# Altium footprint library Connectors SMD.PcbLib: 130 footprints (part 1 of 12) (continued)
## ERNI_054594 [mm] "12 Contacts Pitch 1.27  SMC Right Angle Male Connector Type B" (continued)
  text "a6" at -4,-2.8 h1
  text "a1" at 2.7,-2.8 h1
  text "b" at 4.78,0.6 h0.9
  text "a" at 4.725,-0.5 h0.9
  text "6" at -3.875,-0.2 h0.9
3D body: height 4.25, standoff -0.7, extent -6.285,-9.085 6.285,0.915

## ERNI_054595 [mil] "26 Contacts Pitch 1.27  SMC Right Angle Male Connector Type B"
height 165.35
pads (32):
  rect 31.5x31.5 smd: A1(300,-25) A2(250,-25) A3(200,-25) A4(150,-25) A5(100,-25) A6(50,-25) A7(0,-25) A8(-50,-25) A9(-100,-25) A10(-150,-25) A11(-200,-25) A12(-250,-25) A13(-300,-25) B1(300,25) B2(250,25) B3(200,25) B4(150,25) B5(100,25) B6(50,25) B7(0,25) B8(-50,25) B9(-100,25) B10(-150,25) B11(-200,25) B12(-250,25) B13(-300,25)
  rect 47.24x98.43 smd: Mec1(-398.82,-3.35) Mec2(-398.82,-204.13) Mec3(398.82,-3.35) Mec4(398.82,-204.13)
  round 39.37 hole 62.99 unplated mask+15.75: Mec5(-387.01,-103.74) Mec6(387.01,-103.74)
Top Overlay:
  circle w9.84: c300,65 r4.92
  lines w7.87: -378.78,-265 -378.78,-355.73 378.78,-355.73 378.78,-265 ; -365,-32.87 -351.22,-32.87 -348.77,-39.6 ccw(c-330.27,-32.87) -330.27,-52.55 330.27,-52.55 ccw(c330.27,-32.87) 348.77,-39.6 351.22,-32.87 365,-32.87 ; -351.61,-158.86 351.61,-158.86
  text "a" at 358.27,-20.67 h35.43
  text "b" at 362.2,22.64 h35.43
  text "13" at -326.77,-16.73 h35.43
Mechanical 8:
  drawing of 188 lines, arcs and shapes, not listed
Mechanical 14:
  drawing of 326 lines, arcs and shapes, not listed
  text "b" at 362.2,22.64 h35.43
  text "a" at 358.27,-20.67 h35.43
  text "13" at -326.77,-16.73 h35.43
  text "a1" at 290.55,-110.24 h39.37
  text "a13" at -330.71,-110.24 h39.37
Mechanical 15:
  lines w1.97: -432.33,-365.58 432.33,-365.58 432.33,55.71 -432.33,55.71 -432.33,-365.58
3D body: height 165.35, standoff 0, extent -431.44,-356.31 413.53,37.4

## ERNI_054596 [mil] "50 Contacts Pitch 1.27  SMC Right Angle Male Connector Type B"
height 165.35
pads (56):
  rect 31.5x31.5 smd: A1(600,-25) A2(550,-25) A3(500,-25) A4(450,-25) A5(400,-25) A6(350,-25) A7(300,-25) A8(250,-25) A9(200,-25) A10(150,-25) A11(100,-25) A12(50,-25) A13(0,-25) A14(-50,-25) A15(-100,-25) A16(-150,-25) A17(-200,-25) A18(-250,-25) A19(-300,-25) A20(-350,-25) A21(-400,-25) A22(-450,-25) A23(-500,-25) A24(-550,-25) A25(-600,-25) B1(600,25) B2(550,25) B3(500,25) B4(450,25) B5(400,25) B6(350,25) B7(300,25) B8(250,25) B9(200,25) B10(150,25) B11(100,25) B12(50,25) B13(0,25) B14(-50,25) B15(-100,25) B16(-150,25) B17(-200,25) B18(-250,25) B19(-300,25) B20(-350,25) B21(-400,25) B22(-450,25) B23(-500,25) B24(-550,25) B25(-600,25)
  rect 47.24x98.43 smd: Mec1(-698.82,-3.35) Mec2(-698.43,-204.13) Mec3(698.43,-3.35) Mec4(699.21,-204.13)
  round 39.37 hole 62.99 unplated mask+15.75: Mec5(-687.01,-103.74) Mec6(687.01,-103.74)
Top Overlay:
  circle w9.84: c600,65 r4.92
  lines w7.87: -678.74,-271.65 -678.74,-355.71 681.26,-355.71 681.26,-271.65 ; -659.45,-50.71 659.45,-50.71
  text "25" at -627.95,-26.57 h35.43
  text "a" at 657.28,-33.46 h35.43
  text "b" at 662.2,20.67 h35.43
Mechanical 8:
  lines w1.97: 615.75,9.25 615.75,40.75
Mechanical 13:
  lines w3.94: -728.74,-260.71 -728.74,54.29 -663.74,54.29 -663.74,-50.71 671.26,-50.71 671.26,54.29 731.26,54.29 731.26,-260.71 681.26,-260.71 681.26,-355.71 -678.74,-355.71 -678.74,-260.71 -728.74,-260.71
Mechanical 14:
  lines w3.94: -728.74,-260.71 -728.74,54.29 -663.74,54.29 -663.74,-50.71 671.26,-50.71 671.26,54.29 731.26,54.29 731.26,-260.71 681.26,-260.71 681.26,-355.71 -678.74,-355.71 -678.74,-260.71 -728.74,-260.71
  text "b" at 662.2,20.67 h35.43
  text "a" at 657.28,-33.46 h35.43
  text "a1" at 590.55,-110.24 h39.37
  text "a25" at -629.92,-110.24 h39.37
Mechanical 15:
  lines w1.97: -739.17,-366.14 741.14,-366.14
  lines w3.94: -739.17,-366.14 -739.17,63.98 741.14,63.98 741.14,-366.14
3D body: height 165.35, standoff 0, extent -728.72,-355.69 731.24,54.27

## ERNI_063209 [mm] "26 Contacts Pitch 1.27  SMC Straight Male Connector Type Q"
height 8.2
pads (32):
  rect 0.8x1.1 smd: A1(7.623,-2.75) A2(6.353,-2.75) A3(5.083,-2.75) A4(3.813,-2.75) A5(2.543,-2.75) A6(1.273,-2.75) A7(0.003,-2.75) A8(-1.267,-2.75) A9(-2.537,-2.75) A10(-3.807,-2.75) A11(-5.077,-2.75) A12(-6.347,-2.75) A13(-7.617,-2.75) B1(7.623,2.75) B2(6.353,2.75) B3(5.083,2.75) B4(3.812,2.75) B5(2.542,2.75) B6(1.272,2.75) B7(0.002,2.75) B8(-1.268,2.75) B9(-2.538,2.75) B10(-3.808,2.75) B11(-5.078,2.75) B12(-6.348,2.75) B13(-7.618,2.75)
  rect 1.2x2.5 smd: Mec1(10.133,-2.55) Mec2(10.123,2.55) Mec3(-10.118,-2.55) Mec4(-10.138,2.55)
  round 1 hole 1.6 unplated mask+0.3: Mec5(9.833,0) Mec6(-9.828,0)
Top Overlay:
  circle w0.25: c7.622,-3.766 r0.125
  lines w0.2: -9.228,0.922 -9.228,1.625 9.233,1.625 9.233,0.922 ; -9.2,1.9 9.2,1.9 ; -9.028,-0.77 -9.028,-1.925 ; -8.928,0.65 -8.928,1.325 8.933,1.325 8.933,0.65 ; -8.728,-0.15 -8.728,-1.625 ; -8.728,0.15 -8.428,0.15 -8.428,-1.325 8.433,-1.325 8.433,0.15 8.733,0.15 ; 8.733,-0.15 8.733,-1.625 ; 9.033,-0.77 9.033,-1.925 ; -9.028,-1.925 9.033,-1.925 ; -9.028,-1.925 -8.728,-1.625 ; -8.728,-1.625 8.733,-1.625 ; 8.733,-1.625 9.033,-1.925 ; -7.83,-0.783 -7.41,-0.783 -7.41,-0.485 -7.83,-0.485 -7.83,-0.783 ; -7.83,0.487 -7.41,0.487 -7.41,0.785 -7.83,0.785 -7.83,0.487 ; -6.56,-0.783 -6.14,-0.783 -6.14,-0.485 -6.56,-0.485 -6.56,-0.783 ; -6.56,0.487 -6.14,0.487 -6.14,0.785 -6.56,0.785 -6.56,0.487 ; -5.29,-0.783 -4.87,-0.783 -4.87,-0.485 -5.29,-0.485 -5.29,-0.783 ; -5.29,0.487 -4.87,0.487 -4.87,0.785 -5.29,0.785 -5.29,0.487 ; -4.02,-0.783 -3.6,-0.783 -3.6,-0.485 -4.02,-0.485 -4.02,-0.783 ; -4.02,0.487 -3.6,0.487 -3.6,0.785 -4.02,0.785 -4.02,0.487 ; -2.75,-0.783 -2.33,-0.783 -2.33,-0.485 -2.75,-0.485 -2.75,-0.783 ; -2.75,0.487 -2.33,0.487 -2.33,0.785 -2.75,0.785 -2.75,0.487 ; -1.48,-0.783 -1.06,-0.783 -1.06,-0.485 -1.48,-0.485 -1.48,-0.783 ; -1.48,0.487 -1.06,0.487 -1.06,0.785 -1.48,0.785 -1.48,0.487 ; -0.21,-0.783 0.21,-0.783 0.21,-0.485 -0.21,-0.485 -0.21,-0.783 ; -0.21,0.487 0.21,0.487 0.21,0.785 -0.21,0.785 -0.21,0.487 ; 1.06,-0.783 1.48,-0.783 1.48,-0.485 1.06,-0.485 1.06,-0.783 ; 1.06,0.487 1.48,0.487 1.48,0.785 1.06,0.785 1.06,0.487 ; 2.33,-0.783 2.75,-0.783 2.75,-0.485 2.33,-0.485 2.33,-0.783 ; 2.33,0.487 2.75,0.487 2.75,0.785 2.33,0.785 2.33,0.487 ; 3.6,-0.783 4.02,-0.783 4.02,-0.485 3.6,-0.485 3.6,-0.783 ; 3.6,0.487 4.02,0.487 4.02,0.785 3.6,0.785 3.6,0.487 ; 4.87,-0.783 5.29,-0.783 5.29,-0.485 4.87,-0.485 4.87,-0.783 ; 4.87,0.487 5.29,0.487 5.29,0.785 4.87,0.785 4.87,0.487 ; 6.14,-0.783 6.56,-0.783 6.56,-0.485 6.14,-0.485 6.14,-0.783 ; 6.14,0.487 6.56,0.487 6.56,0.785 6.14,0.785 6.14,0.487 ; 7.41,-0.783 7.83,-0.783 7.83,-0.485 7.41,-0.485 7.41,-0.783 ; 7.41,0.487 7.83,0.487 7.83,0.785 7.41,0.785 7.41,0.487
  text "a1" at 9.232,-3.325 h0.9
  text "b1" at 9.232,2.375 h0.9
  text "13" at -8.303,-3.7 h0.9
Mechanical 8:
  drawing of 166 lines, arcs and shapes, not listed
Mechanical 14:
  drawing of 186 lines, arcs and shapes, not listed
  text "13" at -8.303,-3.7 h0.9
  text "a1" at 9.232,-3.325 h0.9
  text "b1" at 9.232,2.375 h0.9
3D body: height 8.25, standoff -0.7, extent -10.727,-3.6 10.733,3.6

## ERNI_063210 [mm] "50 Contacts Pitch 1.27  SMC Straight Male Connector Type Q"
height 8.2
pads (56):
  rect 0.8x1.1 smd: A1(15.24,-2.75) A2(13.97,-2.75) A3(12.7,-2.75) A4(11.43,-2.75) A5(10.16,-2.75) A6(8.89,-2.75) A7(7.62,-2.75) A8(6.35,-2.75) A9(5.08,-2.75) A10(3.81,-2.75) A11(2.54,-2.75) A12(1.27,-2.75) A13(0,-2.75) A14(-1.27,-2.75) A15(-2.54,-2.75) A16(-3.81,-2.75) A17(-5.08,-2.75) A18(-6.35,-2.75) A19(-7.62,-2.75) A20(-8.89,-2.75) A21(-10.16,-2.75) A22(-11.43,-2.75) A23(-12.7,-2.75) A24(-13.97,-2.75) A25(-15.24,-2.75) B1(15.24,2.75) B2(13.97,2.75) B3(12.7,2.75) B4(11.43,2.75) B5(10.16,2.75) B6(8.89,2.75) B7(7.62,2.75) B8(6.35,2.75) B9(5.08,2.75) B10(3.81,2.75) B11(2.54,2.75) B12(1.27,2.75) B13(0,2.75) B14(-1.27,2.75) B15(-2.54,2.75) B16(-3.81,2.75) B17(-5.08,2.75) B18(-6.35,2.75) B19(-7.62,2.75) B20(-8.89,2.75) B21(-10.16,2.75) B22(-11.43,2.75) B23(-12.7,2.75) B24(-13.97,2.75) B25(-15.24,2.75)
  rect 1.2x2.5 smd: Mec1(17.75,-2.55) Mec2(17.74,2.55) Mec3(-17.74,-2.55) Mec4(-17.76,2.55)
  round 1 hole 1.6 unplated mask+0.3: Mec5(17.45,0) Mec6(-17.45,0)
Top Overlay:
  drawing of 221 lines, arcs and shapes, not listed
  text "a1" at 16.825,-3.325 h0.9
  text "b1" at 16.85,2.325 h0.9
  text "25" at -15.95,-3.725 h0.9
Mechanical 8:
  drawing of 262 lines, arcs and shapes, not listed
Mechanical 14:
  drawing of 280 lines, arcs and shapes, not listed
  text "a1" at 16.825,-3.325 h0.9
  text "b1" at 16.85,2.325 h0.9
  text "25" at -15.95,-3.725 h0.9
3D body: height 8.25, standoff -0.7, extent -18.35,-3.6 18.35,3.6

## ERNI_064317 [mm] "26 Contacts Pitch 1.27  SMC Type B Straight Female Connector"
height 6.2
pads (32):
  rect 0.8x1.1 smd: A1(7.62,2.75) A2(6.35,2.75) A3(5.08,2.75) A4(3.81,2.75) A5(2.54,2.75) A6(1.27,2.75) A7(0,2.75) A8(-1.27,2.75) A9(-2.54,2.75) A10(-3.81,2.75) A11(-5.08,2.75) A12(-6.35,2.75) A13(-7.62,2.75) B1(7.62,-2.75) B2(6.35,-2.75) B3(5.08,-2.75) B4(3.81,-2.75) B5(2.54,-2.75) B6(1.27,-2.75) B7(0,-2.75) B8(-1.27,-2.75) B9(-2.54,-2.75) B10(-3.81,-2.75) B11(-5.08,-2.75) B12(-6.35,-2.75) B13(-7.62,-2.75)
  rect 1.2x2.5 smd: Mec1(10.133,-2.55) Mec2(10.123,2.55) Mec3(-10.118,-2.55) Mec4(-10.138,2.55)
  round 1 hole 1.6 unplated mask+0.3: Mec5(9.83,0) Mec6(-9.83,0)
Top Overlay:
  drawing of 347 lines, arcs and shapes, not listed
  text "26" at -8.32,-3.875 h0.9
  text "a1" at 9.22,2.55 h0.9
  text "b1" at 9.245,-3.5 h0.9
Mechanical 8:
  drawing of 252 lines, arcs and shapes, not listed
Mechanical 14:
  drawing of 397 lines, arcs and shapes, not listed
  text "26" at -8.32,-3.875 h0.9
  text "a1" at 9.22,2.55 h0.9
  text "b1" at 9.245,-3.5 h0.9
Mechanical 15:
  lines w0.1: -10.98,-4.05 10.98,-4.05 10.98,4.05 -10.98,4.05 -10.98,-4.05
3D body: height 6.3, standoff -0.65, extent -10.695,-3.6 10.695,3.6

## ERNI_064318 [mm] "12 Contacts Pitch 1.27  SMC Vertical Female Connector Type B"
height 6.2
pads (18):
  rect 0.8x1.1 smd: A1(3.175,2.75) A2(1.905,2.75) A3(0.635,2.75) A4(-0.635,2.75) A5(-1.905,2.75) A6(-3.175,2.75) B1(3.175,-2.75) B2(1.905,-2.75) B3(0.635,-2.75) B4(-0.635,-2.75) B5(-1.905,-2.75) B6(-3.175,-2.75)
  rect 1.2x2.5 smd: Mec1(-5.685,2.55) Mec2(-5.685,-2.55) Mec3(5.685,2.55) Mec4(5.685,-2.55)
  round 1 hole 1.6 unplated mask+0.6: Mech5(-5.385,0) Mech6(5.385,0)
Top Overlay:
  circle w0.25: c3.175,3.766 r0.125
  lines w0.2: -4.785,-1.9 4.785,-1.9 ; -4.785,1.9 4.785,1.9 ; -4.685,-0.9 -4.685,-1.525 ; -4.385,-0.32 -4.385,-1.225 ; -4.372,-0.275 -3.885,-0.275 ; -4.335,0.025 -4.185,0.025 -4.185,1.525 ; -4.185,0.025 -3.885,-0.275 ; 4.185,0.025 3.885,-0.275 ; 4.335,0.025 4.185,0.025 4.185,1.525 ; 4.372,-0.275 3.885,-0.275 ; 4.385,-0.32 4.385,-1.225 ; 4.685,-0.783 4.685,-1.525 ; -4.685,-1.525 4.685,-1.525 ; -4.685,-1.525 -4.385,-1.225 ; -4.385,-1.225 4.385,-1.225 ; -4.185,1.525 -3.885,1.225 ; -4.185,1.525 4.185,1.525 ; -3.885,-0.275 -3.885,1.225 ; -3.885,1.225 3.885,1.225 ; -1.173,0.125 -1.173,1.135 ; -1.173,0.125 -0.097,0.125 ; -1.173,0.125 -1.173,1.135 ; -1.173,0.125 -0.097,0.125 ; -1.173,1.135 -0.097,1.135 ; -1.173,1.135 -0.097,1.135 ; -0.873,0.435 -0.873,0.835 ; -0.873,0.435 -0.397,0.435 ; -0.873,0.435 -0.873,0.835 ; -0.873,0.435 -0.397,0.435 ; -0.873,0.835 -0.397,0.835 ; -0.873,0.835 -0.397,0.835 ; -0.397,0.435 -0.397,0.835 ; -0.397,0.435 -0.397,0.835 ; -0.097,0.125 -0.097,1.135 ; -0.097,0.125 -0.097,1.135 ; 3.885,-0.275 3.885,1.225 ; 3.885,1.225 4.185,1.525 ; 4.385,-1.225 4.685,-1.525 ; -3.713,-1.145 -3.713,-0.135 -2.637,-0.135 -2.637,-1.145 -3.713,-1.145 ; -3.713,0.125 -3.713,1.135 -2.637,1.135 -2.637,0.125 -3.713,0.125 ; -3.413,-0.835 -3.413,-0.435 -2.937,-0.435 -2.937,-0.835 -3.413,-0.835 ; -3.413,0.435 -3.413,0.835 -2.937,0.835 -2.937,0.435 -3.413,0.435 ; -2.443,-1.145 -2.443,-0.135 -1.367,-0.135 -1.367,-1.145 -2.443,-1.145 ; -2.443,0.125 -2.443,1.135 -1.367,1.135 -1.367,0.125 -2.443,0.125 ; -2.143,-0.835 -2.143,-0.435 -1.667,-0.435 -1.667,-0.835 -2.143,-0.835 ; -2.143,0.435 -2.143,0.835 -1.667,0.835 -1.667,0.435 -2.143,0.435 ; -1.173,-1.145 -1.173,-0.135 -0.097,-0.135 -0.097,-1.145 -1.173,-1.145 ; -0.873,-0.835 -0.873,-0.435 -0.397,-0.435 -0.397,-0.835 -0.873,-0.835 ; 0.097,-1.145 0.097,-0.135 1.173,-0.135 1.173,-1.145 0.097,-1.145 ; 0.097,0.125 0.097,1.135 1.173,1.135 1.173,0.125 0.097,0.125 ; 0.397,-0.835 0.397,-0.435 0.873,-0.435 0.873,-0.835 0.397,-0.835 ; 0.397,0.435 0.397,0.835 0.873,0.835 0.873,0.435 0.397,0.435 ; 1.367,-1.145 1.367,-0.135 2.443,-0.135 2.443,-1.145 1.367,-1.145 ; 1.367,0.125 1.367,1.135 2.443,1.135 2.443,0.125 1.367,0.125 ; 1.667,-0.835 1.667,-0.435 2.143,-0.435 2.143,-0.835 1.667,-0.835 ; 1.667,0.435 1.667,0.835 2.143,0.835 2.143,0.435 1.667,0.435 ; 2.637,-1.145 2.637,-0.135 3.713,-0.135 3.713,-1.145 2.637,-1.145 ; 2.637,0.125 2.637,1.135 3.713,1.135 3.713,0.125 2.637,0.125 ; 2.937,-0.835 2.937,-0.435 3.413,-0.435 3.413,-0.835 2.937,-0.835 ; 2.937,0.435 2.937,0.835 3.413,0.835 3.413,0.435 2.937,0.435
  text "a1" at 4.8,2.375 h0.9
  text "b1" at 4.8,-3.275 h0.9
  text "b6" at -3.925,-3.575 h0.9
  text "a6" at -3.925,2.35 h0.9
Mechanical 8:
  lines w0.1: -6.685,-2.55 -5.685,-2.55 ; -6.685,2.55 -5.685,2.55 ; -6.385,0 -5.385,0 ; -5.685,-3.55 -5.685,-2.55 ; -5.685,-1.55 -5.685,-2.55 ; -5.685,1.55 -5.685,2.55 ; -5.685,3.55 -5.685,2.55 ; -5.385,-1 -5.385,0 ; -5.385,1 -5.385,0 ; -4.685,-2.55 -5.685,-2.55 ; -4.685,2.55 -5.685,2.55 ; -4.385,0 -5.385,0 ; -3.575,-3.3 -3.175,-2.75 ; -3.575,-2.2 -3.175,-2.75 ; -3.575,2.2 -3.175,2.75 ; -3.575,3.3 -3.175,2.75 ; -2.775,-3.3 -3.175,-2.75 ; -2.775,-2.2 -3.175,-2.75 ; -2.775,2.2 -3.175,2.75 ; -2.775,3.3 -3.175,2.75 ; -2.305,-3.3 -1.905,-2.75 ; -2.305,-2.2 -1.905,-2.75 ; -2.305,2.2 -1.905,2.75 ; -2.305,3.3 -1.905,2.75 ; -1.505,-3.3 -1.905,-2.75 ; -1.505,-2.2 -1.905,-2.75 ; -1.505,2.2 -1.905,2.75 ; -1.505,3.3 -1.905,2.75 ; -1.035,-3.3 -0.635,-2.75 ; -1.035,-2.2 -0.635,-2.75 ; -1.035,2.2 -0.635,2.75 ; -1.035,3.3 -0.635,2.75 ; -1,0 0,0 ; -0.235,-3.3 -0.635,-2.75 ; -0.235,-2.2 -0.635,-2.75 ; -0.235,2.2 -0.635,2.75 ; -0.235,3.3 -0.635,2.75 ; 0,-1 0,0 ; 0,1 0,0 ; 0.235,-3.3 0.635,-2.75 ; 0.235,-2.2 0.635,-2.75 ; 0.235,2.2 0.635,2.75 ; 0.235,3.3 0.635,2.75 ; 1,0 0,0 ; 1.035,-3.3 0.635,-2.75 ; 1.035,-2.2 0.635,-2.75 ; 1.035,2.2 0.635,2.75 ; 1.035,3.3 0.635,2.75 ; 1.505,-3.3 1.905,-2.75 ; 1.505,-2.2 1.905,-2.75 ; 1.505,2.2 1.905,2.75 ; 1.505,3.3 1.905,2.75 ; 2.305,-3.3 1.905,-2.75 ; 2.305,-2.2 1.905,-2.75 ; 2.305,2.2 1.905,2.75 ; 2.305,3.3 1.905,2.75 ; 2.775,-3.3 3.175,-2.75 ; 2.775,-2.2 3.175,-2.75 ; 2.775,2.2 3.175,2.75 ; 2.775,3.3 3.175,2.75 ; 3.575,-3.3 3.175,-2.75 ; 3.575,-2.2 3.175,-2.75 ; 3.575,2.2 3.175,2.75 ; 3.575,3.3 3.175,2.75 ; 4.385,0 5.385,0 ; 4.685,-2.55 5.685,-2.55 ; 4.685,2.55 5.685,2.55 ; 5.385,-1 5.385,0 ; 5.385,1 5.385,0 ; 5.685,-3.55 5.685,-2.55 ; 5.685,-1.55 5.685,-2.55 ; 5.685,1.55 5.685,2.55 ; 5.685,3.55 5.685,2.55 ; 6.385,0 5.385,0 ; 6.685,-2.55 5.685,-2.55 ; 6.685,2.55 5.685,2.55
Mechanical 14:
  drawing of 236 lines, arcs and shapes, not listed
  text "a1" at 4.8,2.375 h0.9
  text "b1" at 4.8,-3.275 h0.9
  text "b6" at -3.925,-3.575 h0.9
  text "a6" at -3.925,2.35 h0.9
Mechanical 15:
  lines w0.1: -6.285,-3.8 -6.285,-1.3 -5.085,-1.3 -5.085,-3.8 -6.285,-3.8 ; -6.285,1.3 -6.285,3.8 -5.085,3.8 -5.085,1.3 -6.285,1.3 ; -3.575,-3.3 -2.775,-3.3 -2.775,-2.2 -3.575,-2.2 -3.575,-3.3 ; -3.575,2.2 -2.775,2.2 -2.775,3.3 -3.575,3.3 -3.575,2.2 ; -2.305,-3.3 -1.505,-3.3 -1.505,-2.2 -2.305,-2.2 -2.305,-3.3 ; -2.305,2.2 -1.505,2.2 -1.505,3.3 -2.305,3.3 -2.305,2.2 ; -1.035,-3.3 -0.235,-3.3 -0.235,-2.2 -1.035,-2.2 -1.035,-3.3 ; -1.035,2.2 -0.235,2.2 -0.235,3.3 -1.035,3.3 -1.035,2.2 ; 0.235,-3.3 1.035,-3.3 1.035,-2.2 0.235,-2.2 0.235,-3.3 ; 0.235,2.2 1.035,2.2 1.035,3.3 0.235,3.3 0.235,2.2 ; 1.505,-3.3 2.305,-3.3 2.305,-2.2 1.505,-2.2 1.505,-3.3 ; 1.505,2.2 2.305,2.2 2.305,3.3 1.505,3.3 1.505,2.2 ; 2.775,-3.3 3.575,-3.3 3.575,-2.2 2.775,-2.2 2.775,-3.3 ; 2.775,2.2 2.775,3.3 3.575,3.3 3.575,2.2 2.775,2.2 ; 5.085,-3.8 5.085,-1.3 6.285,-1.3 6.285,-3.8 5.085,-3.8 ; 5.085,1.3 6.285,1.3 6.285,3.8 5.085,3.8 5.085,1.3
3D body: height 6.25, standoff -0.75, extent -6.35,-3.6 6.35,3.6

## ERNI_064321 [mm] "12 Contacts Pitch 1.27  SMC Vertical Male Connector Type Q"
height 6.7
pads (18):
  rect 0.8x1.1 smd: A1(3.175,-2.75) A2(1.905,-2.75) A3(0.635,-2.75) A4(-0.635,-2.75) A5(-1.905,-2.75) A6(-3.175,-2.75) B1(3.175,2.75) B2(1.905,2.75) B3(0.635,2.75) B4(-0.635,2.75) B5(-1.905,2.75) B6(-3.175,2.75)
  rect 1.2x2.5 smd: Mec1(-5.685,2.55) Mec2(-5.685,-2.55) Mec3(5.685,2.55) Mec4(5.685,-2.55)
  round 1 hole 1.6 unplated mask+0.6: Mech5(-5.385,0) Mech6(5.385,0)
Top Overlay:
  circle w0.25: c3.175,3.766 r0.125
  lines w0.2: -4.785,0.8 -4.785,1.625 4.785,1.625 4.785,0.8 ; -4.685,-0.714 -4.685,-2.025 ; -4.396,-0.15 -4.285,-0.15 -4.285,-1.625 4.285,-1.625 ; -4.285,-1.625 -4.685,-2.025 ; -3.93,-2.025 -4.685,-2.025 ; 3.93,-2.025 4.685,-2.025 ; 4.396,-0.15 4.285,-0.15 4.285,-1.625 ; 4.685,-0.714 4.685,-2.025 ; 4.285,-1.625 4.685,-2.025 ; -3.385,-0.785 -3.385,-0.485 -2.965,-0.485 -2.965,-0.785 -3.385,-0.785 ; -3.385,0.485 -3.385,0.785 -2.965,0.785 -2.965,0.485 -3.385,0.485 ; -2.115,-0.785 -2.115,-0.485 -1.695,-0.485 -1.695,-0.785 -2.115,-0.785 ; -2.115,0.485 -2.115,0.785 -1.695,0.785 -1.695,0.485 -2.115,0.485 ; -0.845,-0.785 -0.845,-0.485 -0.425,-0.485 -0.425,-0.785 -0.845,-0.785 ; -0.845,0.485 -0.845,0.785 -0.425,0.785 -0.425,0.485 -0.845,0.485 ; 0.425,-0.785 0.425,-0.485 0.845,-0.485 0.845,-0.785 0.425,-0.785 ; 0.425,0.485 0.425,0.785 0.845,0.785 0.845,0.485 0.425,0.485 ; 1.695,-0.785 1.695,-0.485 2.115,-0.485 2.115,-0.785 1.695,-0.785 ; 1.695,0.485 1.695,0.785 2.115,0.785 2.115,0.485 1.695,0.485 ; 2.965,-0.785 2.965,-0.485 3.385,-0.485 3.385,-0.785 2.965,-0.785 ; 2.965,0.485 2.965,0.785 3.385,0.785 3.385,0.485 2.965,0.485
  text "b6" at -3.875,2.35 h0.9
  text "a6" at -3.875,-3.775 h0.9
  text "a1" at 4.775,-3.375 h0.9
  text "b1" at 4.8,2.375 h0.9
Mechanical 8:
  lines w0.1: -6.385,0 -5.385,0 ; -5.385,-1 -5.385,0 ; -5.385,1 -5.385,0 ; -4.385,0 -5.385,0 ; -3.575,-3.3 -3.175,-2.75 ; -3.575,-2.2 -3.175,-2.75 ; -3.575,2.2 -3.175,2.75 ; -3.575,3.3 -3.175,2.75 ; -2.775,-3.3 -3.175,-2.75 ; -2.775,-2.2 -3.175,-2.75 ; -2.775,2.2 -3.175,2.75 ; -2.775,3.3 -3.175,2.75 ; -2.305,-3.3 -1.905,-2.75 ; -2.305,-2.2 -1.905,-2.75 ; -2.305,2.2 -1.905,2.75 ; -2.305,3.3 -1.905,2.75 ; -1.505,-3.3 -1.905,-2.75 ; -1.505,-2.2 -1.905,-2.75 ; -1.505,2.2 -1.905,2.75 ; -1.505,3.3 -1.905,2.75 ; -1.035,-3.3 -0.635,-2.75 ; -1.035,-2.2 -0.635,-2.75 ; -1.035,2.2 -0.635,2.75 ; -1.035,3.3 -0.635,2.75 ; -1,0 0,0 ; -0.235,-3.3 -0.635,-2.75 ; -0.235,-2.2 -0.635,-2.75 ; -0.235,2.2 -0.635,2.75 ; -0.235,3.3 -0.635,2.75 ; 0,-1 0,0 ; 0,1 0,0 ; 0.235,-3.3 0.635,-2.75 ; 0.235,-2.2 0.635,-2.75 ; 0.235,2.2 0.635,2.75 ; 0.235,3.3 0.635,2.75 ; 1,0 0,0 ; 1.035,-3.3 0.635,-2.75 ; 1.035,-2.2 0.635,-2.75 ; 1.035,2.2 0.635,2.75 ; 1.035,3.3 0.635,2.75 ; 1.505,-3.3 1.905,-2.75 ; 1.505,-2.2 1.905,-2.75 ; 1.505,2.2 1.905,2.75 ; 1.505,3.3 1.905,2.75 ; 2.305,-3.3 1.905,-2.75 ; 2.305,-2.2 1.905,-2.75 ; 2.305,2.2 1.905,2.75 ; 2.305,3.3 1.905,2.75 ; 2.775,-3.3 3.175,-2.75 ; 2.775,-2.2 3.175,-2.75 ; 2.775,2.2 3.175,2.75 ; 2.775,3.3 3.175,2.75 ; 3.575,-3.3 3.175,-2.75 ; 3.575,-2.2 3.175,-2.75 ; 3.575,2.2 3.175,2.75 ; 3.575,3.3 3.175,2.75 ; 4.385,0 5.385,0 ; 5.385,-1 5.385,0 ; 5.385,1 5.385,0 ; 6.385,0 5.385,0
Mechanical 14:
  drawing of 180 lines, arcs and shapes, not listed
  text "b6" at -3.875,2.35 h0.9
  text "a6" at -3.875,-3.775 h0.9
  text "a1" at 4.775,-3.375 h0.9
  text "b1" at 4.8,2.375 h0.9
Mechanical 15:
  lines w0.1: -6.285,-3.8 -6.285,-1.3 -5.085,-1.3 -5.085,-3.8 -6.285,-3.8 ; -6.285,1.3 -6.285,3.8 -5.085,3.8 -5.085,1.3 -6.285,1.3 ; -3.575,-3.3 -2.775,-3.3 -2.775,-2.2 -3.575,-2.2 -3.575,-3.3 ; -3.575,2.2 -2.775,2.2 -2.775,3.3 -3.575,3.3 -3.575,2.2 ; -2.305,-3.3 -1.505,-3.3 -1.505,-2.2 -2.305,-2.2 -2.305,-3.3 ; -2.305,2.2 -1.505,2.2 -1.505,3.3 -2.305,3.3 -2.305,2.2 ; -1.035,-3.3 -0.235,-3.3 -0.235,-2.2 -1.035,-2.2 -1.035,-3.3 ; -1.035,2.2 -0.235,2.2 -0.235,3.3 -1.035,3.3 -1.035,2.2 ; 0.235,-3.3 1.035,-3.3 1.035,-2.2 0.235,-2.2 0.235,-3.3 ; 0.235,2.2 1.035,2.2 1.035,3.3 0.235,3.3 0.235,2.2 ; 1.505,-3.3 2.305,-3.3 2.305,-2.2 1.505,-2.2 1.505,-3.3 ; 1.505,2.2 2.305,2.2 2.305,3.3 1.505,3.3 1.505,2.2 ; 2.775,-3.3 3.575,-3.3 3.575,-2.2 2.775,-2.2 2.775,-3.3 ; 2.775,2.2 2.775,3.3 3.575,3.3 3.575,2.2 2.775,2.2 ; 5.085,-3.8 5.085,-1.3 6.285,-1.3 6.285,-3.8 5.085,-3.8 ; 5.085,1.3 6.285,1.3 6.285,3.8 5.085,3.8 5.085,1.3
3D body: height 6.7, standoff -0.75, extent -6.35,-3.6 6.35,3.6

## ERNI_124045 [mm] "50 Contacts Pitch 1.27  SMC Straight Female Connector Type B"
height 9.05
pads (56):
  rect 0.8x1.1 smd: A1(15.24,2.75) A2(13.97,2.75) A3(12.7,2.75) A4(11.43,2.75) A5(10.16,2.75) A6(8.89,2.75) A7(7.62,2.75) A8(6.35,2.75) A9(5.08,2.75) A10(3.81,2.75) A11(2.54,2.75) A12(1.27,2.75) A13(0,2.75) A14(-1.27,2.75) A15(-2.54,2.75) A16(-3.81,2.75) A17(-5.08,2.75) A18(-6.35,2.75) A19(-7.62,2.75) A20(-8.89,2.75) A21(-10.16,2.75) A22(-11.43,2.75) A23(-12.7,2.75) A24(-13.97,2.75) A25(-15.24,2.75) B1(15.24,-2.75) B2(13.97,-2.75) B3(12.7,-2.75) B4(11.43,-2.75) B5(10.16,-2.75) B6(8.89,-2.75) B7(7.62,-2.75) B8(6.35,-2.75) B9(5.08,-2.75) B10(3.81,-2.75) B11(2.54,-2.75) B12(1.27,-2.75) B13(0,-2.75) B14(-1.27,-2.75) B15(-2.54,-2.75) B16(-3.81,-2.75) B17(-5.08,-2.75) B18(-6.35,-2.75) B19(-7.62,-2.75) B20(-8.89,-2.75) B21(-10.16,-2.75) B22(-11.43,-2.75) B23(-12.7,-2.75) B24(-13.97,-2.75) B25(-15.24,-2.75)
  rect 1.2x2.5 smd: Mec1(17.75,-2.55) Mec2(17.75,2.55) Mec3(-17.75,-2.55) Mec4(-17.75,2.55)
  round 1 hole 1.6 unplated mask+0.3: Mec5(17.45,0) Mec6(-17.45,0)
Top Overlay:
  drawing of 448 lines, arcs and shapes, not listed
  text "25" at -15.9,-3.4 h0.9
  text "a1" at 16.865,2.375 h0.9
  text "b1" at 16.865,-3.275 h0.9
Mechanical 8:
  drawing of 260 lines, arcs and shapes, not listed
Mechanical 14:
  drawing of 1664 lines, arcs and shapes, not listed
  text "a1" at 16.865,2.375 h0.9
  text "b1" at 16.865,-3.275 h0.9
3D body: height 9.05, standoff -0.75, extent -18.415,-3.5 18.415,3.5

## ERNI_154741 [mil] "SMC, 26 Contacts Pitch 1.27, Dual Row Right Angle Female Connectors: Type Q"
height 151.57
pads (32):
  rect 31.5x31.5 smd: A1(-300,-25) A2(-250,-25) A3(-200,-25) A4(-150,-25) A5(-100,-25) A6(-50,-25) A7(0,-25) A8(50,-25) A9(100,-25) A10(150,-25) A11(200,-25) A12(250,-25) A13(300,-25) B1(-300,25) B2(-250,25) B3(-200,25) B4(-150,25) B5(-100,25) B6(-50,25) B7(0,25) B8(50,25) B9(100,25) B10(150,25) B11(200,25) B12(250,25) B13(300,25)
  rect 47.24x106.3 smd: Mec1(-398.82,-7.28) Mec2(-398.82,-200.2) Mec3(398.82,-7.28) Mec4(398.82,-200.2)
  round 39.37 hole 62.99 unplated mask+15.75: Mec5(-387.01,-103.74) Mec6(387.01,-103.74)
Top Overlay:
  circle w9.84: c-300,65 r4.92
  lines w7.87: -363.39,-182.5 363.39,-182.5 ; -359.17,-182.5 -359.17,-375.46 ; 359.17,-182.5 359.17,-375.46 ; -359.17,-375.46 359.17,-375.46 ; -359.17,-375.46 -347.34,-387.2 347.34,-387.2 359.17,-375.46
  text "13" at 365.16,-25.59 h35.43
  text "b" at -328.54,8.27 h35.43
  text "a" at -328.54,-41.73 h35.43
Mechanical 8:
  drawing of 252 lines, arcs and shapes, not listed
Mechanical 14:
  lines w3.94: -420.2,-160.24 -420.2,-245.51 -378.88,-245.51 -378.88,-182.5 378.88,-182.5 378.88,-245.51 420.2,-245.51 420.2,-160.24 ; -420.2,-47.3 -420.2,37.97 -378.88,37.97 -378.88,-21.18 -394.57,-21.18 -394.57,-186.53 -378.88,-186.53 ; -394.57,-166.82 -408.87,-166.82 -424.66,-157.65 -424.66,-49.89 -409.02,-40.81 -394.57,-40.81 ; -378.88,-9.35 378.88,-9.35 ; -359.17,-182.5 -359.17,-375.46 ; -318.28,-9.35 -318.28,36.77 -289.99,36.77 -289.99,13.2 -312.45,13.2 -312.45,-9.35 ; -268.39,-9.35 -268.39,36.77 -240.02,36.77 -240.02,13.2 -262.48,13.2 -262.48,-9.35 ; -218.42,-9.35 -218.42,36.77 -190.13,36.77 -190.13,13.2 -212.5,13.2 -212.5,-9.35 ; -168.44,-9.35 -168.44,36.77 -140.15,36.77 -140.15,13.2 -162.53,13.2 -162.53,-9.35 ; -118.47,-9.35 -118.47,36.77 -90.18,36.77 -90.18,13.2 -112.55,13.2 -112.55,-9.35 ; -68.58,-9.35 -68.58,36.77 -40.2,36.77 -40.2,13.2 -62.66,13.2 -62.66,-9.35 ; -18.52,-9.35 -18.52,36.77 9.77,36.77 9.77,13.2 -12.6,13.2 -12.6,-9.35 ; 31.37,-9.35 31.37,36.77 59.75,36.77 59.75,13.2 37.29,13.2 37.29,-9.35 ; 81.35,-9.35 81.35,36.77 109.72,36.77 109.72,13.2 87.26,13.2 87.26,-9.35 ; 131.32,-9.35 131.32,36.77 159.61,36.77 159.61,13.2 137.24,13.2 137.24,-9.35 ; 181.3,-9.35 181.3,36.77 209.59,36.77 209.59,13.2 187.21,13.2 187.21,-9.35 ; 231.27,-9.35 231.27,36.77 259.56,36.77 259.56,13.2 237.1,13.2 237.1,-9.35 ; 281.25,-9.35 281.25,36.77 309.54,36.77 309.54,13.2 287.16,13.2 287.16,-9.35 ; 359.17,-182.5 359.17,-375.46 ; 378.88,-186.53 394.57,-186.53 394.57,-21.18 378.88,-21.18 ; 392.69,-21.18 378.88,-21.18 ; 394.57,-166.82 408.87,-166.82 424.66,-157.65 424.66,-49.89 409.02,-40.81 394.57,-40.81 ; 420.2,-47.3 420.2,37.97 378.88,37.97 378.88,-21.18 ; -359.17,-375.46 359.17,-375.46 ; -359.17,-375.46 -347.34,-387.2 347.34,-387.2 359.17,-375.46
  text "a1" at -319.37,-98.19 h35.43
  text "a13" at 246.06,-98.66 h39.37
  text "a" at -328.54,-41.73 h35.43
  text "b" at -328.54,8.27 h35.43
3D body: height 151.57, standoff -29.53, extent -425,-387.2 425,38